# Altium footprint library Connector_art.PcbLib: 209 footprints (part 12 of 14)
Each footprint in its own frame and in the unit in brackets; x right, y up, seen from the top. Pads: shape width x height; smd on the part's side, far side on the other; paste and mask are expansions set on the pad; w line width, h text height; cw(c..) or ccw(c..) is an arc to the next point about the centre after c.
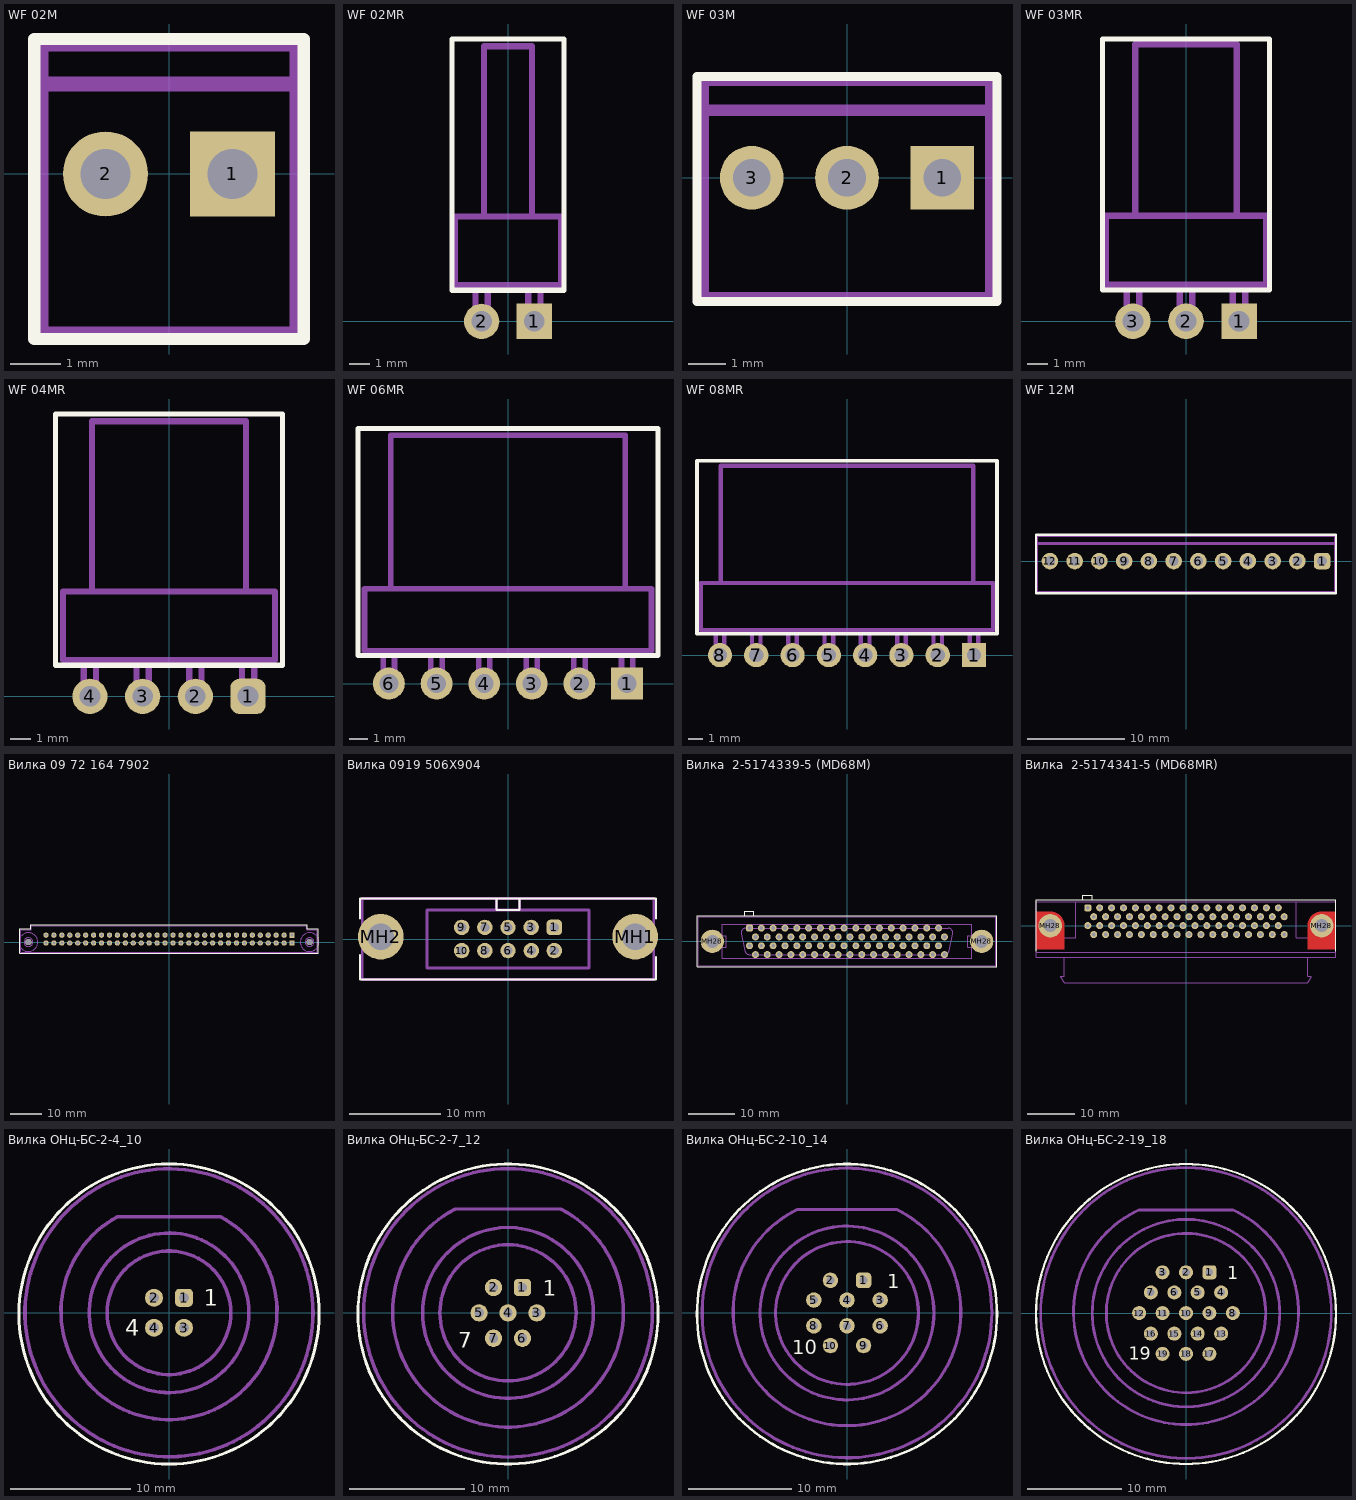
[diagram p11: the footprints below, top view; thin cyan lines are the x and y axes]

## WF 02M [mm]
height 11.5
pads (2):
  rect 1.7x1.7 hole 1: 1(1.27,0)
  round 1.7 hole 1: 2(-1.27,0)
Top Overlay:
  lines w0.25: -2.7,-3.3 -2.7,2.7 2.7,2.7 2.7,-3.3 -2.7,-3.3
Mechanical 1:
  lines w0.3: -2.56,1.8 2.56,1.8 ; -2.56,-3.2 -2.56,2.6 2.56,2.6 2.56,-3.2 -2.56,-3.2
3D body: height 11.5, standoff -3.4, extent -2.56,-3.2 2.56,2.6

## WF 02MR [mm]
height 5.8
pads (2):
  rect 1.7x1.7 hole 1: 1(1.27,0)
  round 1.7 hole 1: 2(-1.27,0)
Top Overlay:
  lines w0.25: -2.7,1.5 2.7,1.5 2.7,13.6 -2.7,13.6 -2.7,1.5
Mechanical 1:
  lines w0.3: -1.57,1.75 -1.57,0 -0.97,0 -0.97,1.75 ; -1.15,5.05 -1.15,13.25 1.15,13.25 1.15,5.05 ; 0.97,1.75 0.97,0 1.57,0 1.57,1.75 ; -2.56,1.75 2.56,1.75 2.56,5.05 -2.56,5.05 -2.56,1.75
3D body: height 5.8, standoff -3, extent -2.56,-0.32 2.56,13.25

## WF 03M [mm]
height 11.5
pads (3):
  rect 1.7x1.7 hole 1: 1(2.54,0)
  round 1.7 hole 1: 2(0,0) 3(-2.54,0)
Top Overlay:
  lines w0.25: -4,-3.3 4,-3.3 4,2.7 -4,2.7 -4,-3.3
Mechanical 1:
  lines w0.3: -3.83,1.8 3.83,1.8 ; -3.83,-3.2 3.83,-3.2 3.83,2.6 -3.83,2.6 -3.83,-3.2
3D body: height 11.5, standoff -3.4, extent -3.83,-3.2 3.83,2.6

## WF 03MR [mm]
height 5.8
pads (3):
  rect 1.7x1.7 hole 1: 1(2.54,0)
  round 1.7 hole 1: 2(0,0) 3(-2.54,0)
Top Overlay:
  lines w0.25: -4,1.5 -4,13.5 4,13.5 4,1.5 -4,1.5
Mechanical 1:
  lines w0.25: 2.3,5.05 2.43,5.05 ; 2.3,13.25 2.43,13.25
  lines w0.3: -2.84,1.75 -2.84,0 -2.24,0 -2.24,1.75 ; -2.43,5.05 -2.43,13.25 2.43,13.25 2.43,5.05 ; -0.3,1.75 -0.3,0 0.3,0 0.3,1.75 ; 2.24,1.75 2.24,0 2.84,0 2.84,1.75 ; -3.83,1.75 3.83,1.75 3.83,5.05 -3.83,5.05 -3.83,1.75
3D body: height 5.8, standoff -3, extent -3.83,-0.32 3.83,13.25

## WF 04MR [mm]
height 5.8
pads (4):
  rrect50% 1.7x1.7 hole 1: 1(3.81,0)
  round 1.7 hole 1: 2(1.27,0) 3(-1.27,0) 4(-3.81,0)
Top Overlay:
  lines w0.25: -5.46,1.5 5.46,1.5 5.46,13.6 -5.46,13.6 -5.46,1.5
Mechanical 1:
  lines w0.3: -4.11,1.75 -4.11,0 -3.51,0 -3.51,1.75 ; -3.71,5.05 -3.71,13.25 3.71,13.25 3.71,5.05 ; -1.57,1.75 -1.57,0 -0.97,0 -0.97,1.75 ; 0.97,1.75 0.97,0 1.57,0 1.57,1.75 ; 3.51,1.75 3.51,0 4.11,0 4.11,1.75 ; -5.11,1.75 5.11,1.75 5.11,5.05 -5.11,5.05 -5.11,1.75
3D body: height 5.8, standoff -3, extent -5.1,-0.32 5.1,13.25

## WF 06MR [mm]
height 5.8
pads (6):
  rect 1.7x1.7 hole 1: 1(6.35,0)
  round 1.7 hole 1: 2(3.81,0) 3(1.27,0) 4(-1.27,0) 5(-3.81,0) 6(-6.35,0)
Top Overlay:
  lines w0.25: -8,1.5 8,1.5 8,13.6 -8,13.6 -8,1.5
Mechanical 1:
  lines w0.3: -6.65,1.75 -6.65,0 -6.05,0 -6.05,1.75 ; -6.25,5.05 -6.25,13.25 6.25,13.25 6.25,5.05 ; -4.11,1.75 -4.11,0 -3.51,0 -3.51,1.75 ; -1.57,1.75 -1.57,0 -0.97,0 -0.97,1.75 ; 0.97,1.75 0.97,0 1.57,0 1.57,1.75 ; 3.51,1.75 3.51,0 4.11,0 4.11,1.75 ; 6.05,1.75 6.05,0 6.65,0 6.65,1.75 ; -7.65,1.75 7.65,1.75 7.65,5.05 -7.65,5.05 -7.65,1.75
3D body: height 5.8, standoff -3, extent -7.65,-0.32 7.65,13.25

## WF 08MR [mm]
height 5.8
pads (8):
  rect 1.7x1.7 hole 1: 1(8.89,0)
  round 1.7 hole 1: 2(6.35,0) 3(3.81,0) 4(1.27,0) 5(-1.27,0) 6(-3.81,0) 7(-6.35,0) 8(-8.89,0)
Top Overlay:
  lines w0.25: -10.5,1.5 10.5,1.5 10.5,13.6 -10.5,13.6 -10.5,1.5
Mechanical 1:
  lines w0.3: -9.19,1.75 -9.19,0 -8.59,0 -8.59,1.75 ; -8.84,5.05 -8.84,13.25 8.84,13.25 8.84,5.05 ; -6.65,1.75 -6.65,0 -6.05,0 -6.05,1.75 ; -4.11,1.75 -4.11,0 -3.51,0 -3.51,1.75 ; -1.57,1.75 -1.57,0 -0.97,0 -0.97,1.75 ; 0.97,1.75 0.97,0 1.57,0 1.57,1.75 ; 3.51,1.75 3.51,0 4.11,0 4.11,1.75 ; 6.05,1.75 6.05,0 6.65,0 6.65,1.75 ; 8.59,1.75 8.59,0 9.19,0 9.19,1.75 ; -10.24,1.75 10.24,1.75 10.24,5.05 -10.24,5.05 -10.24,1.75
3D body: height 5.8, standoff -3, extent -10.24,-0.32 10.24,13.25

## WF 12M [mm]
height 11.5
pads (12):
  rrect50% 1.7x1.7 hole 1: 1(13.97,0)
  round 1.7 hole 1: 2(11.43,0) 3(8.89,0) 4(6.35,0) 5(3.81,0) 6(1.27,0) 7(-1.27,0) 8(-3.81,0) 9(-6.35,0) 10(-8.89,0) 11(-11.43,0) 12(-13.97,0)
Top Overlay:
  lines w0.25: -15.4,-3.3 15.4,-3.3 15.4,2.7 -15.4,2.7 -15.4,-3.3
Mechanical 1:
  lines w0.3: -15.34,1.8 15.34,1.8 ; -15.34,-3.2 15.34,-3.2 15.34,2.6 -15.34,2.6 -15.34,-3.2
3D body: height 11.5, standoff -3.4, extent -15.34,-3.2 15.34,2.6

## Вилка 09 72 164 7902 [mm]
height 11.6
pads (66):
  rect 1.7x1.7 hole 1: 1A(39.37,2.24) 1B(39.37,-0.3)
  round 1.7 hole 1: 2A(36.83,2.24) 2B(36.83,-0.3) 3A(34.29,2.24) 3B(34.29,-0.3) 4A(31.75,2.24) 4B(31.75,-0.3) 5A(29.21,2.24) 5B(29.21,-0.3) 6A(26.67,2.24) 6B(26.67,-0.3) 7A(24.13,2.24) 7B(24.13,-0.3) 8A(21.59,2.24) 8B(21.59,-0.3) 9A(19.05,2.24) 9B(19.05,-0.3) 10A(16.51,2.24) 10B(16.51,-0.3) 11A(13.97,2.24) 11B(13.97,-0.3) 12A(11.43,2.24) 12B(11.43,-0.3) 13A(8.89,2.24) 13B(8.89,-0.3) 14A(6.35,2.24) 14B(6.35,-0.3) 15A(3.81,2.24) 15B(3.81,-0.3) 16A(1.27,2.24) 16B(1.27,-0.3) 17A(-1.27,2.24) 17B(-1.27,-0.3) 18A(-3.81,2.24) 18B(-3.81,-0.3) 19A(-6.35,2.24) 19B(-6.35,-0.3) 20A(-8.89,2.24) 20B(-8.89,-0.3) 21A(-11.43,2.24) 21B(-11.43,-0.3) 22A(-13.97,2.24) 22B(-13.97,-0.3) 23A(-16.51,2.24) 23B(-16.51,-0.3) 24A(-19.05,2.24) 24B(-19.05,-0.3) 25A(-21.59,2.24) 25B(-21.59,-0.3) 26A(-24.13,2.24) 26B(-24.13,-0.3) 27A(-26.67,2.24) 27B(-26.67,-0.3) 28A(-29.21,2.24) 28B(-29.21,-0.3) 29A(-31.75,2.24) 29B(-31.75,-0.3) 30A(-34.29,2.24) 30B(-34.29,-0.3) 31A(-36.83,2.24) 31B(-36.83,-0.3) 32A(-39.37,2.24) 32B(-39.37,-0.3)
  round 2 hole 2 unplated: MH1(-45,0) MH2(45,0)
Top Overlay:
  lines w0.25: -47.75,-3.5 47.75,-3.5 47.75,4.25 44.25,4.25 44.25,5.5 -44.25,5.5 -44.25,4.25 -47.75,4.25 -47.75,-3.5
Mechanical 1:
  circle w0.3: c-45,0 r1.4
  circle w0.3: c45,0 r1.4
  lines w0.3: -47.5,-3.25 47.5,-3.25 47.5,4 44,4 44,5.25 -44,5.25 -44,4 -47.5,4 -47.5,-3.25
Mechanical 2:
  circle w0.3: c-45,0 r3
  circle w0.3: c45,0 r3
3D body: height 11.6, standoff -2.5, extent -47.5,-3.33 47.5,5.27

## Вилка 0919 506X904 [mm]
height 26
pads (12):
  rrect50% 1.7x1.7 hole 1: 1(5.08,1.27)
  round 1.7 hole 1: 2(5.08,-1.27) 3(2.54,1.27) 4(2.56,-1.27) 5(0,1.27) 6(0,-1.27) 7(-2.54,1.27) 8(-2.54,-1.27) 9(-5.08,1.27) 10(-5.08,-1.27)
  round 5 hole 2.9: MH1(13.97,0.25) MH2(-13.97,0.25)
Top Overlay:
  lines w0.25: -16.25,-1.75 -16.25,-4.445 16.25,-4.445 16.25,-2 ; -16.25,2.25 -16.25,4.445 16.25,4.445 16.25,2.25 ; -1.27,4.445 -1.27,3.175 1.27,3.175 1.27,4.445
Mechanical 1:
  lines w0.3: -1.27,3.175 -1.27,4.445 ; 1.27,3.175 1.27,4.445 ; -16,-4.445 -16,4.445 16,4.445 16,-4.445 -16,-4.445 ; -8.89,-3.175 8.89,-3.175 8.89,3.175 -8.89,3.175 -8.89,-3.175
3D body: height 25.75, standoff -3.2, extent -16.147,-4.25 16.153,4.25

## Вилка  2-5174339-5 (MD68M) [mm]
pads (70):
  rrect50% 1.5x1.5 hole 0.8: 1(-20.955,2.85)
  round 1.5 hole 0.8: 2(-19.685,0.95) 3(-18.415,2.85) 4(-17.145,0.95) 5(-15.875,2.85) 6(-14.605,0.95) 7(-13.335,2.85) 8(-12.065,0.95) 9(-10.795,2.85) 10(-9.525,0.95) 11(-8.255,2.85) 12(-6.985,0.95) 13(-5.715,2.85) 14(-4.445,0.95) 15(-3.175,2.85) 16(-1.905,0.95) 17(-0.635,2.85) 18(0.635,0.95) 19(1.905,2.85) 20(3.175,0.95) 21(4.445,2.85) 22(5.715,0.95) 23(6.985,2.85) 24(8.255,0.95) 25(9.525,2.85) 26(10.795,0.95) 27(12.065,2.85) 28(13.335,0.95) 29(14.605,2.85) 30(15.875,0.95) 31(17.145,2.85) 32(18.415,0.95) 33(19.685,2.85) 35(-20.955,-0.95) 36(-19.685,-2.85) 37(-18.415,-0.95) 38(-17.145,-2.85) 39(-15.875,-0.95) 40(-14.605,-2.85) 41(-13.335,-0.95) 42(-12.065,-2.85) 43(-10.795,-0.95) 44(-9.525,-2.85) 45(-8.255,-0.95) 46(-6.985,-2.85) 47(-5.715,-0.95) 48(-4.445,-2.85) 49(-3.175,-0.95) 50(-1.905,-2.85) 51(-0.635,-0.95) 52(0.635,-2.85) 53(1.905,-0.95) 54(3.175,-2.85) 55(4.445,-0.95) 56(5.715,-2.85) 57(6.985,-0.95) 58(8.255,-2.85) 59(9.525,-0.95) 60(10.795,-2.85) 61(12.065,-0.95) 62(13.335,-2.85) 63(14.605,-0.95) 64(15.875,-2.85) 65(17.145,-0.95) 66(18.415,-2.85) 67(19.685,-0.95) 68(20.955,-2.85)
  round 1.5 hole 0.8 unplated: 34(20.955,0.95)
  round 5 hole 2.8: MH28(-28.95,0) MH28(28.95,0)
Top Overlay:
  lines w0.25: -22,5.5 -22,6.5 -20,6.5 -20,5.5 ; -32.25,-5.5 -32.25,5.5 32.25,5.5 32.25,-5.5 -32.25,-5.5
Mechanical 1:
  lines w0.2: -32,-5.25 32,-5.25 32,5.25 -32,5.25 -32,-5.25
  lines w0.25: -22.742,1.675 -21.935,-2.005 ; -22.735,1.676 cw(c-21.75,1.85) -21.75,2.85 21.75,2.85 cw(c21.75,1.85) 22.735,1.676 ; -21.938,-2.006 ccw(c-20.95,-1.85) -20.95,-2.85 20.95,-2.85 ccw(c20.95,-1.85) 21.95,-1.85 ; 21.935,-2.008 22.742,1.675 ; -26.8,-3.65 -26.8,-1.25 -26,-1.25 -26,1.25 -26.8,1.25 -26.8,3.65 26.8,3.65 26.8,1.25 26,1.25 26,-1.25 26.8,-1.25 26.8,-3.65 -26.8,-3.65
3D body: height 9.3, standoff -3.1, extent -31.955,-5.15 31.955,5.15

## Вилка  2-5174341-5 (MD68MR) [mm]
pads (70):
  rrect50% 1.5x1.5 hole 0.8: 1(-20.955,3.8)
  round 1.5 hole 0.8: 2(-19.685,1.9) 3(-18.415,3.8) 4(-17.145,1.9) 5(-15.875,3.8) 6(-14.605,1.9) 7(-13.335,3.8) 8(-12.065,1.9) 9(-10.795,3.8) 10(-9.525,1.9) 11(-8.255,3.8) 12(-6.985,1.9) 13(-5.715,3.8) 14(-4.445,1.9) 15(-3.175,3.8) 16(-1.905,1.9) 17(-0.635,3.8) 18(0.635,1.9) 19(1.905,3.8) 20(3.175,1.9) 21(4.445,3.8) 22(5.715,1.9) 23(6.985,3.8) 24(8.255,1.9) 25(9.525,3.8) 26(10.795,1.9) 27(12.065,3.8) 28(13.335,1.9) 29(14.605,3.8) 30(15.875,1.9) 31(17.145,3.8) 32(18.415,1.9) 33(19.685,3.8) 34(20.955,1.9) 35(-20.955,0) 36(-19.685,-1.9) 37(-18.415,0) 38(-17.145,-1.9) 39(-15.875,0) 40(-14.605,-1.9) 41(-13.335,0) 42(-12.065,-1.9) 43(-10.795,0) 44(-9.525,-1.9) 45(-8.255,0) 46(-6.985,-1.9) 47(-5.715,0) 48(-4.445,-1.9) 49(-3.175,0) 50(-1.905,-1.9) 51(-0.635,0) 52(0.635,-1.9) 53(1.905,0) 54(3.175,-1.9) 55(4.445,0) 56(5.715,-1.9) 57(6.985,0) 58(8.255,-1.9) 59(9.525,0) 60(10.795,-1.9) 61(12.065,0) 62(13.335,-1.9) 63(14.605,0) 64(15.875,-1.9) 65(17.145,0) 66(18.415,-1.9) 67(19.685,0) 68(20.955,-1.9)
  round 5 hole 2.8: MH28(-28.95,0) MH28(28.95,0)
Top Layer:
  region: 31.95,-5 25.95,-5 25.941,0 25.978,0.471 26.088,0.93 26.269,1.366 26.515,1.769 26.822,2.128 27.181,2.435 27.584,2.681 28.02,2.862 28.479,2.972 28.95,3.009 28.95,3 31.95,3
  region: -31.95,-5 -25.95,-5 -25.941,0 -25.978,0.471 -26.088,0.93 -26.269,1.366 -26.515,1.769 -26.822,2.128 -27.181,2.435 -27.584,2.681 -28.02,2.862 -28.479,2.972 -28.95,3.009 -28.95,3 -31.95,3
Top Overlay:
  lines w0.25: -32,-5.5 -32,5.5 32,5.5 32,-5.5 ; -22,5.5 -22,6.5 -20,6.5 -20,5.5
Mechanical 1:
  lines w0.2: -31.9,-5.7 31.9,-5.7 ; -31.9,-2.6 -23.5,-2.6 -23.5,5.1 ; -26,-6.7 -26,-10.75 -26.75,-10.75 -26.75,-11 -26,-12.2 26,-12.2 26.75,-11 26.75,-10.75 26,-10.75 26,-6.7 ; 23.5,5.1 23.5,-2.6 31.9,-2.6 ; -31.9,-6.7 -31.9,5.1 31.9,5.1 31.9,-6.7 -31.9,-6.7
3D body: height 9.5, standoff -2.9, extent -31.955,-12.21 31.955,5.09

## Вилка ОНц-БС-2-4_10 [mm]
height 20
pads (4):
  rrect50% 1.5x1.5 hole 0.8: 1(1.25,1.25)
  round 1.5 hole 0.8: 2(-1.25,1.25) 3(1.25,-1.25) 4(-1.25,-1.25)
Top Overlay:
  circle w0.25: c0,-0.1 r12.5
  text "1" at 2.9,0.6 h1.38
  text "4" at -3.627,-1.927 h1.38
Bottom Overlay:
  circle w0.25: c0,0 r4.75
  text "1" at 3.5,0.6 h1.38
  text "4" at -2.543,-1.927 h1.38
Mechanical 1:
  circle w0.3: c0,0 r5.15
  circle w0.3: c0,0 r6.65
  circle w0.3: c0,0 r12
  circle w0.3: c1.25,1.25 r0.5
  circle w0.3: c-1.25,1.25 r0.5
  circle w0.3: c-1.25,-1.25 r0.5
  circle w0.3: c1.25,-1.25 r0.5
  lines w0.3: -4.303,8 4.303,8 ; -4.303,8.005 ccw(c0,0.1) 4.303,8.005
  text "1" at 2.6,0.7 h2
  text "4" at -3.5,-1.8 h2
3D body: height 19.9, standoff -3.5, extent -12,-12.695 12,12.695

## Вилка ОНц-БС-2-7_12 [mm]
height 20
pads (7):
  rrect50% 1.5x1.5 hole 0.8: 1(1.25,2.2)
  round 1.5 hole 0.8: 2(-1.25,2.2) 3(2.5,0) 4(0,0) 5(-2.5,0) 6(1.25,-2.2) 7(-1.25,-2.2)
Top Overlay:
  circle w0.25: c0,-0.1 r13
  text "7" at -4.327,-3.027 h1.38
  text "1" at 3,1.5 h1.38
Bottom Overlay:
  circle w0.25: c0,0 r5.75
  text "7" at -3.243,-3.027 h1.38
  text "1" at 3.6,1.5 h1.38
Mechanical 1:
  circle w0.3: c1.25,-2.2 r0.5
  circle w0.3: c-1.25,-2.2 r0.5
  circle w0.3: c-2.5,0 r0.5
  circle w0.3: c0,0 r0.5
  circle w0.3: c2.5,0 r0.5
  circle w0.3: c1.25,2.2 r0.5
  circle w0.3: c-1.25,2.2 r0.5
  circle w0.3: c0,0 r12.5
  circle w0.3: c0,0 r7.4
  circle w0.3: c0,0 r5.9
  lines w0.3: -4.592,8.984 ccw(c0,0.1) 4.592,8.984 ; -4.592,9 4.592,9
  text "7" at -4.2,-2.9 h2
  text "1" at 2.7,1.6 h2
3D body: height 19.9, standoff -3.5, extent -12.5,-13.896 12.5,13.896

## Вилка ОНц-БС-2-10_14 [mm]
height 20
pads (10):
  rrect50% 1.5x1.5 hole 0.8: 1(1.6,3.15)
  round 1.5 hole 0.8: 2(-1.6,3.15) 3(3.2,1.25) 4(0,1.25) 5(-3.2,1.25) 6(3.2,-1.25) 7(0,-1.25) 8(-3.2,-1.25) 9(1.6,-3.15) 10(-1.6,-3.15)
Top Overlay:
  circle w0.25: c0,-0.1 r14.5
  text "10" at -5.3,-4 h1.38
  text "1" at 3.9,2.4 h1.38
Bottom Overlay:
  circle w0.25: c0,0 r6.75
  text "10" at -3.2,-4 h1.38
  text "1" at 4.5,2.4 h1.38
Mechanical 1:
  circle w0.3: c0,0 r14
  circle w0.3: c0,0 r8.4
  circle w0.3: c0,0 r6.9
  circle w0.3: c1.6,3.15 r0.5
  circle w0.3: c-1.6,3.15 r0.5
  circle w0.3: c3.2,1.25 r0.5
  circle w0.3: c0,1.25 r0.5
  circle w0.3: c-3.2,1.25 r0.5
  circle w0.3: c-3.2,-1.25 r0.5
  circle w0.3: c0,-1.25 r0.5
  circle w0.3: c3.2,-1.25 r0.5
  circle w0.3: c1.6,-3.15 r0.5
  circle w0.3: c-1.6,-3.15 r0.5
  lines w0.3: -4.799,9.998 ccw(c0,0.1) 4.799,9.998 ; -4.799,10 4.799,10
  text "10" at -4.9,-3.9 h2
  text "1" at 3.6,2.5 h2
3D body: height 19.9, standoff -3.5, extent -14,-15.596 14,15.596

## Вилка ОНц-БС-2-19_18 [mm]
height 20
pads (19):
  rrect50% 1.5x1.5 hole 0.8: 1(2.5,4.35)
  round 1.5 hole 0.8: 2(0,4.35) 3(-2.5,4.35) 4(3.75,2.2) 5(1.25,2.2) 6(-1.25,2.2) 7(-3.75,2.2) 8(5,0) 9(2.5,0) 10(0,0) 11(-2.5,0) 12(-5,0) 13(3.75,-2.2) 14(1.25,-2.2) 15(-1.25,-2.2) 16(-3.75,-2.2) 17(2.5,-4.35) 18(0,-4.35) 19(-2.5,-4.35)
Top Overlay:
  circle w0.25: c0,-0.1 r16
  text "1" at 4.4,3.6 h1.38
  text "19" at -6.1,-5 h1.38
Bottom Overlay:
  circle w0.25: c0,0 r8.75
  text "1" at 5,3.6 h1.38
  text "19" at -4,-5 h1.38
Mechanical 1:
  circle w0.3: c0,0 r8.5
  circle w0.3: c0,0 r10
  circle w0.3: c0,0 r15.5
  circle w0.3: c2.5,4.35 r0.5
  circle w0.3: c0,4.35 r0.5
  circle w0.3: c-2.5,4.35 r0.5
  circle w0.3: c-3.75,2.2 r0.5
  circle w0.3: c-1.25,2.2 r0.5
  circle w0.3: c1.25,2.2 r0.5
  circle w0.3: c3.75,2.2 r0.5
  circle w0.3: c5,0 r0.5
  circle w0.3: c2.5,0 r0.5
  circle w0.3: c0,0 r0.5
  circle w0.3: c-2.5,0 r0.5
  circle w0.3: c-5,0 r0.5
  circle w0.3: c-3.75,-2.2 r0.5
  circle w0.3: c-1.25,-2.2 r0.5
  circle w0.3: c1.25,-2.2 r0.5
  circle w0.3: c3.75,-2.2 r0.5
  circle w0.3: c2.5,-4.35 r0.5
  circle w0.3: c0,-4.35 r0.5
  circle w0.3: c-2.5,-4.35 r0.5
  lines w0.3: -5.003,11 5.003,11 ; -5.003,11.007 ccw(c0,0.1) 5.003,11.007
  text "1" at 4.1,3.7 h2
  text "19" at -5.7,-4.9 h2
3D body: height 19.9, standoff -3.5, extent -15.5,-15.596 15.5,15.596